# Altium footprint library Lay-51943_B.brd.PcbLib: 38 footprints (part 3 of 3)
Each footprint in its own frame and in the unit in brackets; x right, y up, seen from the top. Pads: shape width x height; smd on the part's side, far side on the other; paste and mask are expansions set on the pad; w line width, h text height; cw(c..) or ccw(c..) is an arc to the next point about the centre after c.
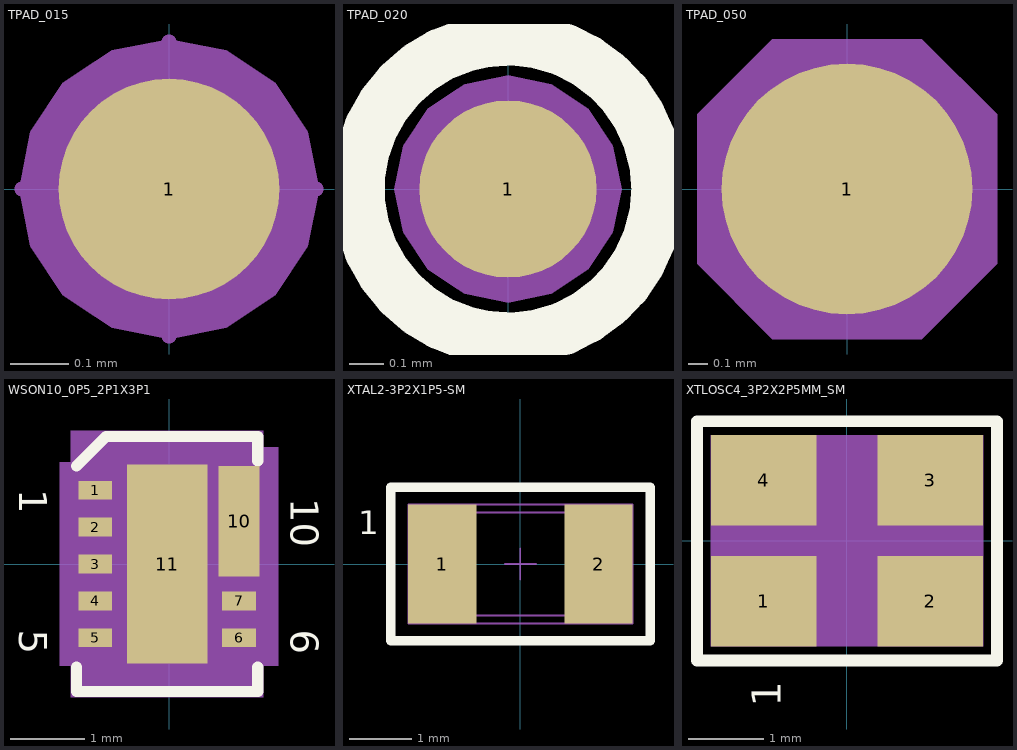
[diagram p2: the footprints below, top view; thin cyan lines are the x and y axes]

## TPAD_015 [mil] "TPAD_015"
pads (1):
  round 15 smd paste-99999: 1(0,0)
Top Courtyard:
  region: 10.2,0 9.42,3.9 7.21,7.21 3.9,9.42 0,10.2 -3.9,9.42 -5.01,8.68 -7.21,7.21 -9.42,3.9 -10.2,0 -9.42,-3.9 -7.21,-7.21 -5.01,-8.68 -3.9,-9.42 0,-10.2 3.9,-9.42 7.21,-7.21 9.42,-3.9
Top Value:
  text ".Comment" at -51.17,-7.5 h15
Top Component Center:
  lines w1: -10,0 10,0 ; 0,-10 0,10
Top Designator:
  text ".Designator" at -54.7,-5.36 h15

## TPAD_020 [mil] "TPAD_020"
pads (1):
  round 20 smd paste-99999: 1(0,0)
Top Overlay:
  circle w6: c0,0 r16.93
Top Value:
  text ".Comment" at -51.17,-7.5 h15
Top Component Center:
  lines w1: -10,0 10,0 ; 0,-10 0,10
Top Designator:
  text ".Designator" at -54.7,-5.36 h15
Top Component Outline:
  region: 12.82,0 11.84,4.9 9.06,9.06 4.9,11.84 0,12.82 -4.9,11.84 -6.3,10.91 -9.06,9.06 -11.84,4.9 -12.82,0 -11.84,-4.9 -9.06,-9.06 -6.3,-10.91 -4.9,-11.84 0,-12.82 4.9,-11.84 9.06,-9.06 11.84,-4.9
  region: 12.82,0 11.84,4.9 9.06,9.06 4.9,11.84 0,12.82 -4.9,11.84 -6.3,10.91 -9.06,9.06 -11.84,4.9 -12.82,0 -11.84,-4.9 -9.06,-9.06 -6.3,-10.91 -4.9,-11.84 0,-12.82 4.9,-11.84 9.06,-9.06 11.84,-4.9
3D body: height 150, standoff 0, extent -12.82,-12.82 12.82,12.82

## TPAD_050 [mil] "TPAD_050"
pads (1):
  round 50 smd paste-99999: 1(0,0)
Top Courtyard:
  region: -14.9,-29.9 -29.9,-14.9 -29.9,14.9 -14.9,29.9 14.9,29.9 29.9,14.9 29.9,-14.9 14.9,-29.9
Top Assembly:
  circle w1: c0,0 r25
Top Value:
  text ".Comment" at -51.17,-7.5 h15
Top Component Center:
  lines w1: -10,0 10,0 ; 0,-10 0,10
Top Designator:
  text ".Designator" at -54.7,-5.36 h15
Top Component Outline:
  region: -14.9,-29.9 -29.9,-14.9 -29.9,14.9 -14.9,29.9 14.9,29.9 29.9,14.9 29.9,-14.9 14.9,-29.9
  region: -14.9,-29.9 -29.9,-14.9 -29.9,14.9 -14.9,29.9 14.9,29.9 29.9,14.9 29.9,-14.9 14.9,-29.9

## WSON10_0P5_2P1X3P1 [mil] "WSON10_0P5_2P1X3P1"
pads (9):
  rect 18x10 smd: 1(-39.39,39.37) 2(-39.39,19.69) 3(-39.39,0) 4(-39.39,-19.69) 5(-39.39,-39.37) 6(37.39,-39.37) 7(37.39,-19.69)
  rect 22x59 smd paste-99999 mask+4: 10(37.39,22.83)
  rect 43x106 smd paste-99999 mask+4: 11(-1,0)
Top Overlay:
  lines w6: -49.34,-55.12 -49.34,-68.02 47.34,-68.02 47.34,-55.12 ; -49.34,52.28 -33.59,68.02 47.34,68.02 47.34,55.12
  text "6" at 65,-35 h15
  text "5" at -80,-35 h15
  text "10" at 65,35 h15
  text "1" at -80,40 h15
Top Paste:
  region: 46.24,39.37 46.24,50.39 28.53,50.39 28.53,39.37
  region: 46.24,17.32 46.24,28.35 28.53,28.35 28.53,17.32
  region: 46.24,-4.72 46.24,6.3 28.53,6.3 28.53,-4.72
  region: -19.46,-4.96 -19.46,-50.16 17.46,-50.16 17.46,-4.96
  region: -19.46,4.96 -19.46,50.16 17.46,50.16 17.46,4.96
Top Solder:
  region: 28.53,50.39 46.25,50.39 46.25,39.37 33.45,39.37 33.45,28.34 46.25,28.34 46.25,17.32 33.45,17.32 33.45,6.29 46.25,6.29 46.25,-4.73 28.53,-4.73
  region: 28.53,50.39 46.25,50.39 46.25,39.37 33.45,39.37 33.45,28.34 46.25,28.34 46.25,17.32 33.45,17.32 33.45,6.29 46.25,6.29 46.25,-4.73 28.53,-4.73
Top Courtyard:
  region: 50.34,-71.02 -52.34,-71.02 -52.34,-54.37 -58.39,-54.37 -58.39,54.37 -52.34,54.37 -52.34,71.02 50.34,71.02 50.34,62.33 58.39,62.33 58.39,-54.37 50.34,-54.37
Top Assembly:
  lines w1: -42.34,-61.02 -42.34,45.28 -26.59,61.02 40.34,61.02 40.34,-61.02 -42.34,-61.02
Top Value:
  text ".Comment" at -7.5,51.17 h15
Top Component Center:
  lines w1: -11,0 9,0 ; -1,-10 -1,10
Top Designator:
  text ".Designator" at -5.36,54.7 h15
Top Component Outline:
  region: -42.34,-61.02 -42.34,-44.37 -48.39,-44.37 -48.39,44.37 -42.34,44.37 -42.34,61.02 40.34,61.02 40.34,52.33 48.39,52.33 48.39,-44.37 40.34,-44.37 40.34,-61.02
  region: -42.34,-61.02 -42.34,-44.37 -48.39,-44.37 -48.39,44.37 -42.34,44.37 -42.34,61.02 40.34,61.02 40.34,52.33 48.39,52.33 48.39,-44.37 40.34,-44.37 40.34,-61.02
3D body "TI_WSON10_DML0010A.stp": height 31.5, standoff 0, extent -39.37,-59.06 39.37,59.06

## XTAL2-3P2X1P5-SM [mil] "XTAL2-3P2X1P5-SM"
pads (2):
  rect 43x75 smd: 1(-49.21,0.02) 2(49.21,0.02)
Top Overlay:
  lines w5.98: -81.69,-48.21 81.69,-48.21 81.69,48.25 -81.69,48.25 -81.69,11.83 -81.69,-48.21
  text "1" at -102.37,18.74 h15
Top Courtyard:
  lines w1: -82.68,-47.22 82.68,-47.22 82.68,47.26 -82.68,47.26 -82.68,-47.22 ; -70.71,-37.5 -70.71,37.5 70.71,37.5 70.71,-37.5 -70.71,-37.5
Top Assembly:
  lines w1: -65.94,-32.46 65.94,-32.46 65.94,32.5 -65.94,32.5 -65.94,-32.46
Top Value:
  text ".Comment" at -51.17,-7.5 h15
Top Gold Plating:
  lines w1: -70.71,-37.5 70.71,-37.5 70.71,37.5 -70.71,37.5 -70.71,-37.5
Top Component Center:
  lines w1: -10,0.02 10,0.02 ; 0,-9.98 0,10.02
Top Designator:
  text ".Designator" at -54.7,-5.36 h15
3D body "ABS07.STEP": height 35.43, standoff 0, extent -63.39,-29.92 63.39,29.92

## XTLOSC4_3P2X2P5MM_SM [mil] "XTLOSC4_3P2X2P5MM_SM"
pads (4):
  rect 55x47 smd: 1(-43.29,-31.5) 2(43.33,-31.5) 3(43.33,31.5) 4(-43.29,31.5)
Top Overlay:
  lines w6: -78.05,-62.32 78.09,-62.32 78.09,62.32 -78.05,62.32 -78.05,-62.32
  text "1" at -34.49,-86.51 h15
Top Assembly:
  lines w1: -64.94,-51.18 64.98,-51.18 64.98,51.18 -64.94,51.18 -64.94,-51.18
Top Value:
  text ".Comment" at -51.17,-7.5 h15
Top Component Center:
  lines w1: -9.98,0 10.02,0 ; 0.02,-10 0.02,10
Top Designator:
  text ".Designator" at -54.7,-5.36 h15
Top Component Outline:
  region: -70.81,-55 70.81,-55 70.81,55 -70.81,55
  region: -70.81,-55 70.81,-55 70.81,55 -70.81,55
3D body "XTAL_3225_07.step": height 27.56, standoff 0, extent -62.99,-49.21 62.99,49.21